# Altium footprint library MH_DA_THU_VIEN_16122016.PcbLib: 531 footprints (part 25 of 34)
Each footprint in its own frame and in the unit in brackets; x right, y up, seen from the top. Pads: shape width x height; smd on the part's side, far side on the other; paste and mask are expansions set on the pad; w line width, h text height; cw(c..) or ccw(c..) is an arc to the next point about the centre after c.
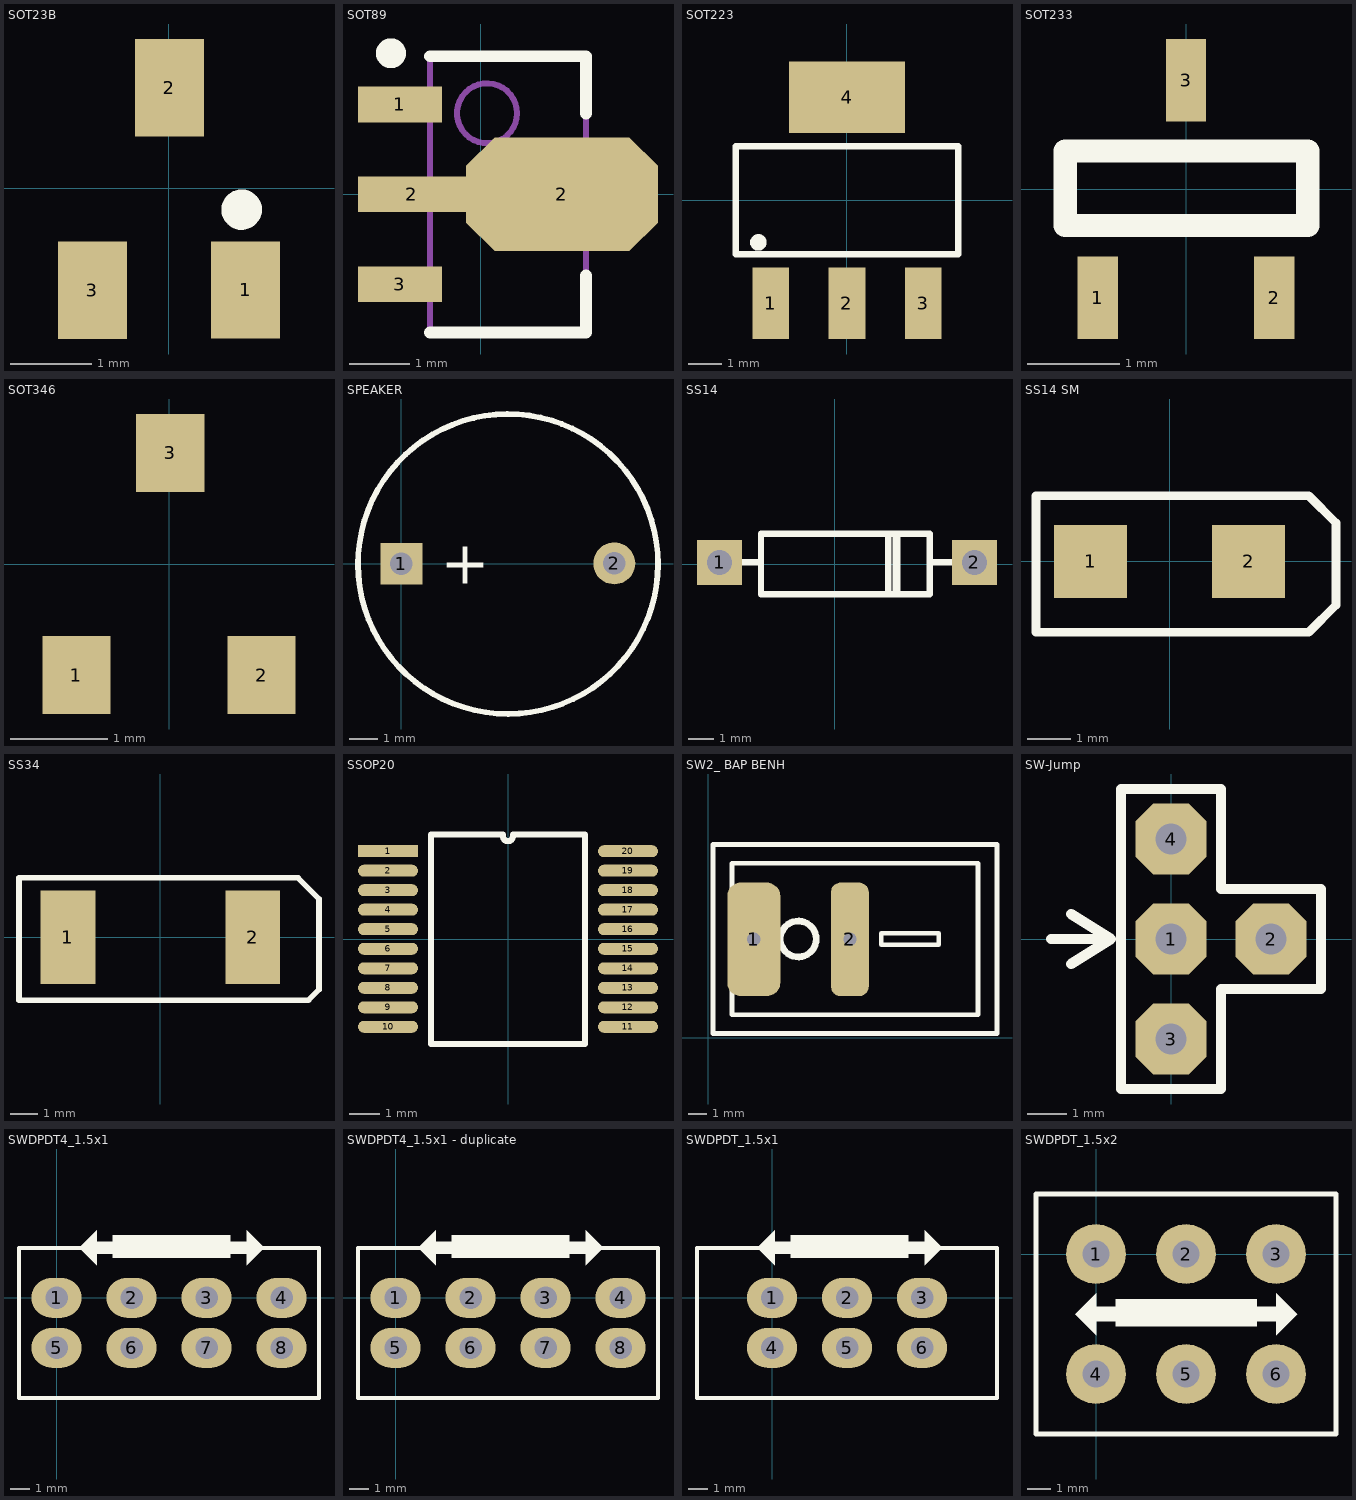
[diagram p24: the footprints below, top view; thin cyan lines are the x and y axes]

## SOT23B [mm]
pads (3):
  rect 0.85x1.2 smd: 1(0.946,-1.255) 2(0.006,1.24) 3(-0.944,-1.26)
Top Overlay:
  circle w0.25: c0.897,-0.264 r0.125
3D body: height 1.06, standoff -0.04, extent -1.494,-1.311 1.506,1.189

## SOT89 [mm]
pads (4):
  rect 1.4x0.6 smd: 1(-1.35,1.5) 3(-1.35,-1.5)
  rect 1.8x0.6 smd: 2(-1.15,0)
  oct 3.2x1.9 smd: 2(1.35,0)
Top Overlay:
  circle w0.25: c-1.5,2.35 r0.125
  lines w0.2: -0.85,-2.3 1.75,-2.3 1.75,-1.35 ; -0.85,2.3 1.75,2.3 1.75,1.35
Mechanical 13:
  circle w0.1: c0.1,1.35 r0.5
  lines w0.1: -0.85,-2.3 1.75,-2.3 1.75,2.3 -0.85,2.3 -0.85,-2.3
Mechanical 15:
  lines w0.1: -0.05,0 0.95,0 ; 0.45,-0.5 0.45,0.5
3D body: height 1.4, standoff 0, extent -1.735,-2.25 2.2,2.25

## SOT223 [mm] "SOT-223/SC-73; 4 Leads; Body 6.7 x 7.3 mm, inc. leads (LxW max)"
height 1.8
pads (4):
  rect 1.1x2.15 smd: 1(-2.3,-3.1) 2(0,-3.1) 3(2.3,-3.1)
  rect 3.5x2.15 smd: 4(0,3.1)
Top Overlay:
  circle w0.25: c-2.665,-1.27 r0.125
  lines w0.2: -3.35,-1.625 -3.35,1.625 3.35,1.625 3.35,-1.625 -3.35,-1.625
3D body: height 2.54, standoff 0, extent -3.429,-1.651 3.429,1.651

## SOT233 [mm]
pads (3):
  rect 0.44x0.9 smd: 1(-0.96,-1.185) 2(0.96,-1.185) 3(0,1.185)
Top Overlay:
  lines w0.254: -1.316,-0.398 1.326,-0.398 1.326,0.415 -1.316,0.415 -1.316,-0.398
3D body: height 1.04, standoff 0.02, extent -1.455,-1.236 1.465,1.24

## SOT346 [mm]
pads (3):
  rect 0.7x0.8 smd: 1(-0.953,-1.143) 2(0.953,-1.143) 3(0.013,1.143)
3D body: height 1.2, standoff 0, extent -1.437,-1.375 1.463,1.425

## SPEAKER [mm]
pads (2):
  rect 1.5x1.5 hole 0.8: 1(0,0)
  round 1.5 hole 0.8: 2(7.62,0.013)
Top Overlay:
  lines w0.203: 7.724,3.67 ccw(c3.816,-0.008) 7.76,3.632
  text "+" at 1.41,-0.711 h1.52
3D body: height 3.99, standoff -10.16, extent -5.669,-6 9.785,6

## SS14 [mm]
pads (2):
  rect 1.8x1.8 hole 1: 1(-4.595,0.064) 2(5.565,0.064)
Top Overlay:
  lines w0.2: 2.39,-1.206 2.39,1.207 ; 2.517,-1.206 2.517,1.207
  lines w0.254: -3.96,0.064 -2.944,0.064 ; 2.136,-1.206 2.136,1.207 ; 3.787,0.064 4.93,0.064 ; -2.944,-1.206 3.787,-1.206 3.787,1.207 -2.944,1.207 -2.944,-1.206
3D body: height 2.55, standoff -2.54, extent -4.976,-1.219 5.946,1.347

## SS14 SM [mm]
pads (2):
  rect 1.7x1.7 smd: 1(-1.841,0) 2(1.841,0)
Top Overlay:
  lines w0.203: -3.111,-1.651 -3.111,1.524 3.238,1.524 3.873,0.889 3.873,-1.016 3.238,-1.651 -3.111,-1.651
3D body: height 2.42, standoff 0.01, extent -2.537,-1.237 2.663,1.363

## SS34 [mm]
pads (2):
  rect 2x3.4 smd: 1(-3.365,0) 2(3.365,0)
Top Overlay:
  lines w0.203: -5.143,-2.286 -5.143,2.159 5.016,2.159 5.779,1.397 5.779,-1.905 5.397,-2.286 -5.143,-2.286
3D body: height 2.42, standoff 0.01, extent -2.663,-1.173 2.537,1.427

## SSOP20 [mm]
pads (20):
  rect 2x0.4 smd: 1(-4,2.925)
  oval 2x0.4 smd: 2(-4,2.275) 3(-4,1.625) 4(-4,0.975) 5(-4,0.325) 6(-4,-0.325) 7(-4,-0.975) 8(-4,-1.625) 9(-4,-2.275) 10(-4,-2.925) 11(4,-2.925) 12(4,-2.275) 13(4,-1.625) 14(4,-0.975) 15(4,-0.325) 16(4,0.325) 17(4,0.975) 18(4,1.625) 19(4,2.275) 20(4,2.925)
Top Overlay:
  lines w0.2: -0.165,3.458 ccw(c-0.002,3.426) 0.16,3.458 ; -0.162,3.482 -0.165,3.484 -2.565,3.484 -2.565,-3.501 2.565,-3.501 2.565,3.458 ; 0.162,3.479 0.763,3.479 1.964,3.479 2.565,3.479
3D body: height 1.9, standoff 0, extent -3.81,-3.596 3.99,3.604

## SW2_ BAP BENH [mm] "Công t?c b?p bênh 2 chân MH001568"
pads (2):
  rrect50% 2.8x6 hole 0.7 square: 1(2.413,5.207)
  rrect50% 2x6 hole 0.7 square: 2(7.493,5.207)
Top Overlay:
  circle w0.254: c4.762,5.225 r1
  circle w0.254: c4.762,5.225 r0.9
  lines w0.254: 0.266,0.225 15.266,0.225 15.266,10.225 0.266,10.225 0.266,0.225 ; 1.266,1.225 14.266,1.225 14.266,9.225 1.266,9.225 1.266,1.225 ; 9.145,4.925 9.145,5.525 12.19,5.525 12.19,4.925 9.145,4.925
3D body: height 13.3, standoff -5.8, extent 0.12,-0.043 15.12,10.457

## SW-Jump [mm]
pads (4):
  oct 1.8x1.8 hole 0.8: 1(0,0) 2(2.54,0) 3(0,-2.54) 4(0,2.54)
Top Overlay:
  lines w0.254: -3.048,0 -1.524,0 ; -2.54,-0.635 -1.524,0 ; -2.54,0.635 -1.524,0 ; -1.27,-3.81 -1.27,1.27 -1.27,-1.27 -1.27,3.81 1.27,3.81 1.27,1.27 3.81,1.27 3.81,-1.27 1.27,-1.27 1.27,-3.81 -1.27,-3.81

## SWDPDT4_1.5x1 [mil] "Switch 3 DPDT, Pin to Pin 150mil, Row to Row 100mil"
pads (8):
  oval 100x80 hole 45: 1(0,0) 2(150,0) 3(300,0) 4(450,0) 5(0,-100) 6(150,-100) 7(300,-100) 8(450,-100)
Top Overlay:
  region: 80,135 80,65 45,100
  region: 380,135 380,65 415,100
  region: 112.5,125 347.5,125 347.5,80 112.5,80
  lines w8: -75,-200 525,-200 525,100 -75,100 -75,-200
  lines w25: 75,100 125,100 ; 335,100 385,100

## SWDPDT4_1.5x1 - duplicate [mil] "Switch 3 DPDT, Pin to Pin 150mil, Row to Row 100mil"
pads (8):
  oval 100x80 hole 45: 1(0,0) 2(150,0) 3(300,0) 4(450,0) 5(0,-100) 6(150,-100) 7(300,-100) 8(450,-100)
Top Overlay:
  region: 112.5,125 347.5,125 347.5,80 112.5,80
  region: 380,135 380,65 415,100
  region: 80,135 80,65 45,100
  lines w8: -75,-200 -75,100 525,100 525,-200 -75,-200
  lines w25: 75,100 125,100 ; 335,100 385,100

## SWDPDT_1.5x1 [mil] "Switch DPDT, Pin to Pin 150mil, Row to Row 100mil"
pads (6):
  oval 100x80 hole 45: 1(0,0) 2(150,0) 3(300,0) 4(0,-100) 5(150,-100) 6(300,-100)
Top Overlay:
  region: 37.5,125 272.5,125 272.5,80 37.5,80
  region: 305,135 305,65 340,100
  region: 5,135 5,65 -30,100
  lines w8: -150,-200 -150,100 450,100 450,-200 -150,-200
  lines w25: 0,100 50,100 ; 260,100 310,100

## SWDPDT_1.5x2 [mil] "Switch DPDT, Pin to Pin 150mil, Row to Row 200mil"
pads (6):
  round 100 hole 45: 1(0,0) 2(150,0) 3(300,0) 4(0,-200) 5(150,-200) 6(300,-200)
Top Overlay:
  region: 32.5,-75 267.5,-75 267.5,-120 32.5,-120
  region: 300,-65 300,-135 335,-100
  region: 0,-65 0,-135 -35,-100
  lines w8: -100,-300 -100,100 400,100 400,-300 -100,-300
  lines w25: -5,-100 45,-100 ; 255,-100 305,-100